# Altium footprint library conn_idc.PcbLib: 5 footprints
Each footprint in its own frame and in the unit in brackets; x right, y up, seen from the top. Pads: shape width x height; smd on the part's side, far side on the other; paste and mask are expansions set on the pad; w line width, h text height; cw(c..) or ccw(c..) is an arc to the next point about the centre after c.
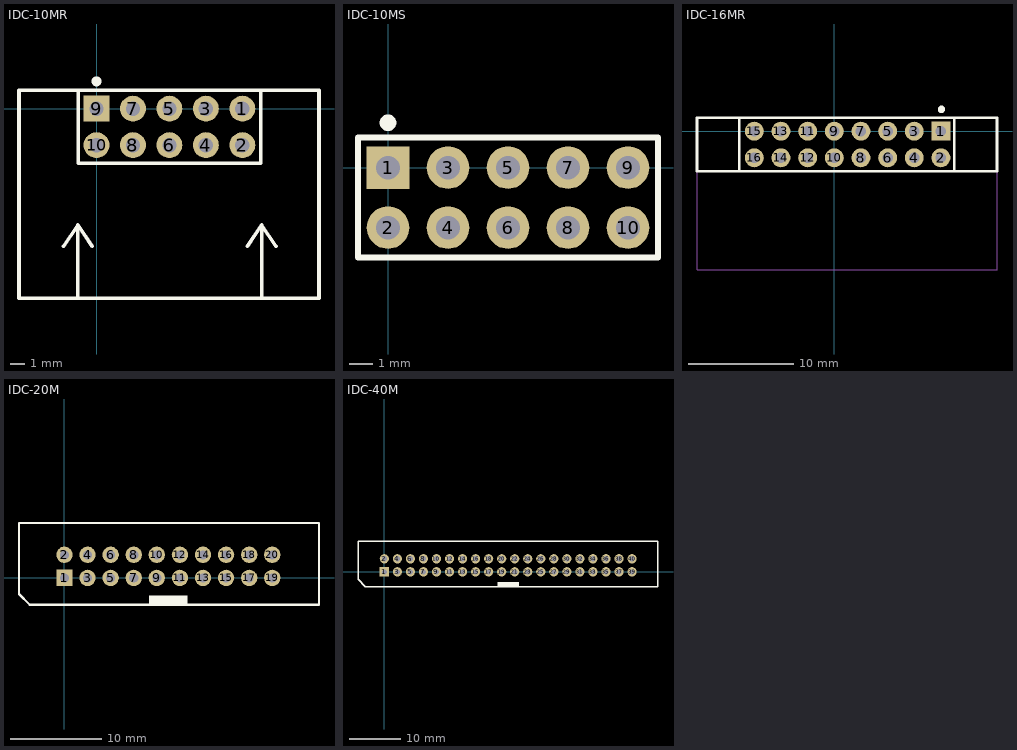
[diagram p0: the footprints below, top view; thin cyan lines are the x and y axes]

## IDC-10MR [mm] "угловой разьем на плату"
pads (10):
  round 1.8 hole 1: 1(10.16,0) 2(10.16,-2.54) 3(7.62,0) 4(7.62,-2.54) 5(5.08,0) 6(5.08,-2.54) 7(2.54,0) 8(2.54,-2.54) 10(0,-2.54)
  rect 1.8x1.8 hole 1: 9(0,0)
Top Overlay:
  circle w0.5: c0,1.9 r0.1
  lines w0.254: -2.3,-9.6 -1.3,-8.1 ; -1.3,1.27 -5.4,1.27 -5.4,-13.2 15.5,-13.2 15.5,1.27 11.43,1.27 ; -1.2,-13.2 -1.3,-13.2 -1.3,-8.1 ; -0.3,-9.6 -1.3,-8.1 ; 10.5,-9.6 11.5,-8.1 ; 11.6,-13.2 11.5,-13.2 11.5,-8.1 ; 12.5,-9.6 11.5,-8.1 ; 11.43,1.27 -1.27,1.27 -1.27,-3.81 11.43,-3.81 11.43,1.27
3D body "IDC-10MR разьем.step": height 7.98, standoff -3.37, extent -5.435,-13.233 15.505,0.327

## IDC-10MS [mm]
pads (10):
  rect 1.8x1.8 hole 1: 1(0,0)
  round 1.8 hole 1: 2(0,-2.54) 3(2.54,0) 4(2.54,-2.54) 5(5.08,0) 6(5.08,-2.54) 7(7.62,0) 8(7.62,-2.54) 9(10.16,0) 10(10.16,-2.54)
Top Overlay:
  circle w0.5: c0,1.9 r0.1
  lines w0.254: -1.27,-3.81 11.43,-3.81 11.43,1.27 -1.27,1.27 -1.27,-3.81
3D body "IDC-10MS.STEP": height 9.45, standoff -3.25, extent -5.12,-6.202 15.28,3.148

## IDC-16MR [mm] "угловой разьем на плату"
pads (16):
  rect 1.8x1.8 hole 1: 1(10.16,0)
  round 1.8 hole 1: 2(10.16,-2.54) 3(7.62,0) 4(7.62,-2.54) 5(5.08,0) 6(5.08,-2.54) 7(2.54,0) 8(2.54,-2.54) 9(0,0) 10(0,-2.54) 11(-2.54,0) 12(-2.54,-2.54) 13(-5.08,0) 14(-5.08,-2.54) 15(-7.62,0) 16(-7.62,-2.54)
Top Overlay:
  lines w0.254: -1.3,1.27 -13.081,1.27 -13.081,-3.81 15.5,-3.81 15.5,1.27 11.43,1.27 ; 11.43,1.27 -9.042,1.27 -9.042,-3.81 11.43,-3.81 11.43,1.27
  lines w0.5: 10.311,2.083 cw(c10.211,2.083) 10.311,2.087
Mechanical 29:
  lines w0.1: -13.081,-13.2 -13.081,1.27 15.5,1.27 15.5,-13.2 -13.081,-13.2
  text ".Designator" at -3.5,-7 h1
3D body "User Library-IDC Socket Male 16pin Angled THT Goldplated 2_54mm.STEP": height 8.98, standoff -2.37, extent -13.01,-13.2 15.55,0.36

## IDC-20M [mm]
pads (20):
  rect 1.8x1.8 hole 1: 1(0,0)
  round 1.8 hole 1: 2(0,2.54) 3(2.54,0) 4(2.54,2.54) 5(5.08,0) 6(5.08,2.54) 7(7.62,0) 8(7.62,2.54) 9(10.16,0) 10(10.16,2.54) 11(12.7,0) 12(12.7,2.54) 13(15.24,0) 14(15.24,2.54) 15(17.78,0) 16(17.78,2.54) 17(20.32,0) 18(20.32,2.54) 19(22.86,0) 20(22.86,2.54)
Top Overlay:
  rectangle: 9.3,-2.98 13.55,-1.96
  lines w0.254: -5,-1.77 -3.81,-2.96 28,-2.96 28,6.04 -5,6.04 -5,-1.77
3D body "IDC-20M.step": height 9.63, standoff -2.77, extent -5.07,-2.98 27.93,5.87

## IDC-40M [mm] "угловой разьем на плату"
pads (40):
  rect 1.8x1.8 hole 1: 1(0,0)
  round 1.8 hole 1: 2(0,2.54) 3(2.54,0) 4(2.54,2.54) 5(5.08,0) 6(5.08,2.54) 7(7.62,0) 8(7.62,2.54) 9(10.16,0) 10(10.16,2.54) 11(12.7,0) 12(12.7,2.54) 13(15.24,0) 14(15.24,2.54) 15(17.78,0) 16(17.78,2.54) 17(20.32,0) 18(20.32,2.54) 19(22.86,0) 20(22.86,2.54) 21(25.4,0) 22(25.4,2.54) 23(27.94,0) 24(27.94,2.54) 25(30.48,0) 26(30.48,2.54) 27(33.02,0) 28(33.02,2.54) 29(35.56,0) 30(35.56,2.54) 31(38.1,0) 32(38.1,2.54) 33(40.64,0) 34(40.64,2.54) 35(43.18,0) 36(43.18,2.54) 37(45.72,0) 38(45.72,2.54) 39(48.26,0) 40(48.26,2.54)
Top Overlay:
  rectangle: 22,-2.826 26.25,-1.96
  lines w0.254: -5.131,-1.461 -5.131,5.918 53.315,5.918 53.315,-2.87 -3.722,-2.87 -5.131,-1.461
3D body "IDC-40M.step": height 9.63, standoff -2.77, extent -5.06,-2.977 53.34,5.873